# Altium footprint library MyLib.PcbLib: 45 footprints (part 2 of 3)
Each footprint in its own frame and in the unit in brackets; x right, y up, seen from the top. Pads: shape width x height; smd on the part's side, far side on the other; paste and mask are expansions set on the pad; w line width, h text height; cw(c..) or ccw(c..) is an arc to the next point about the centre after c.
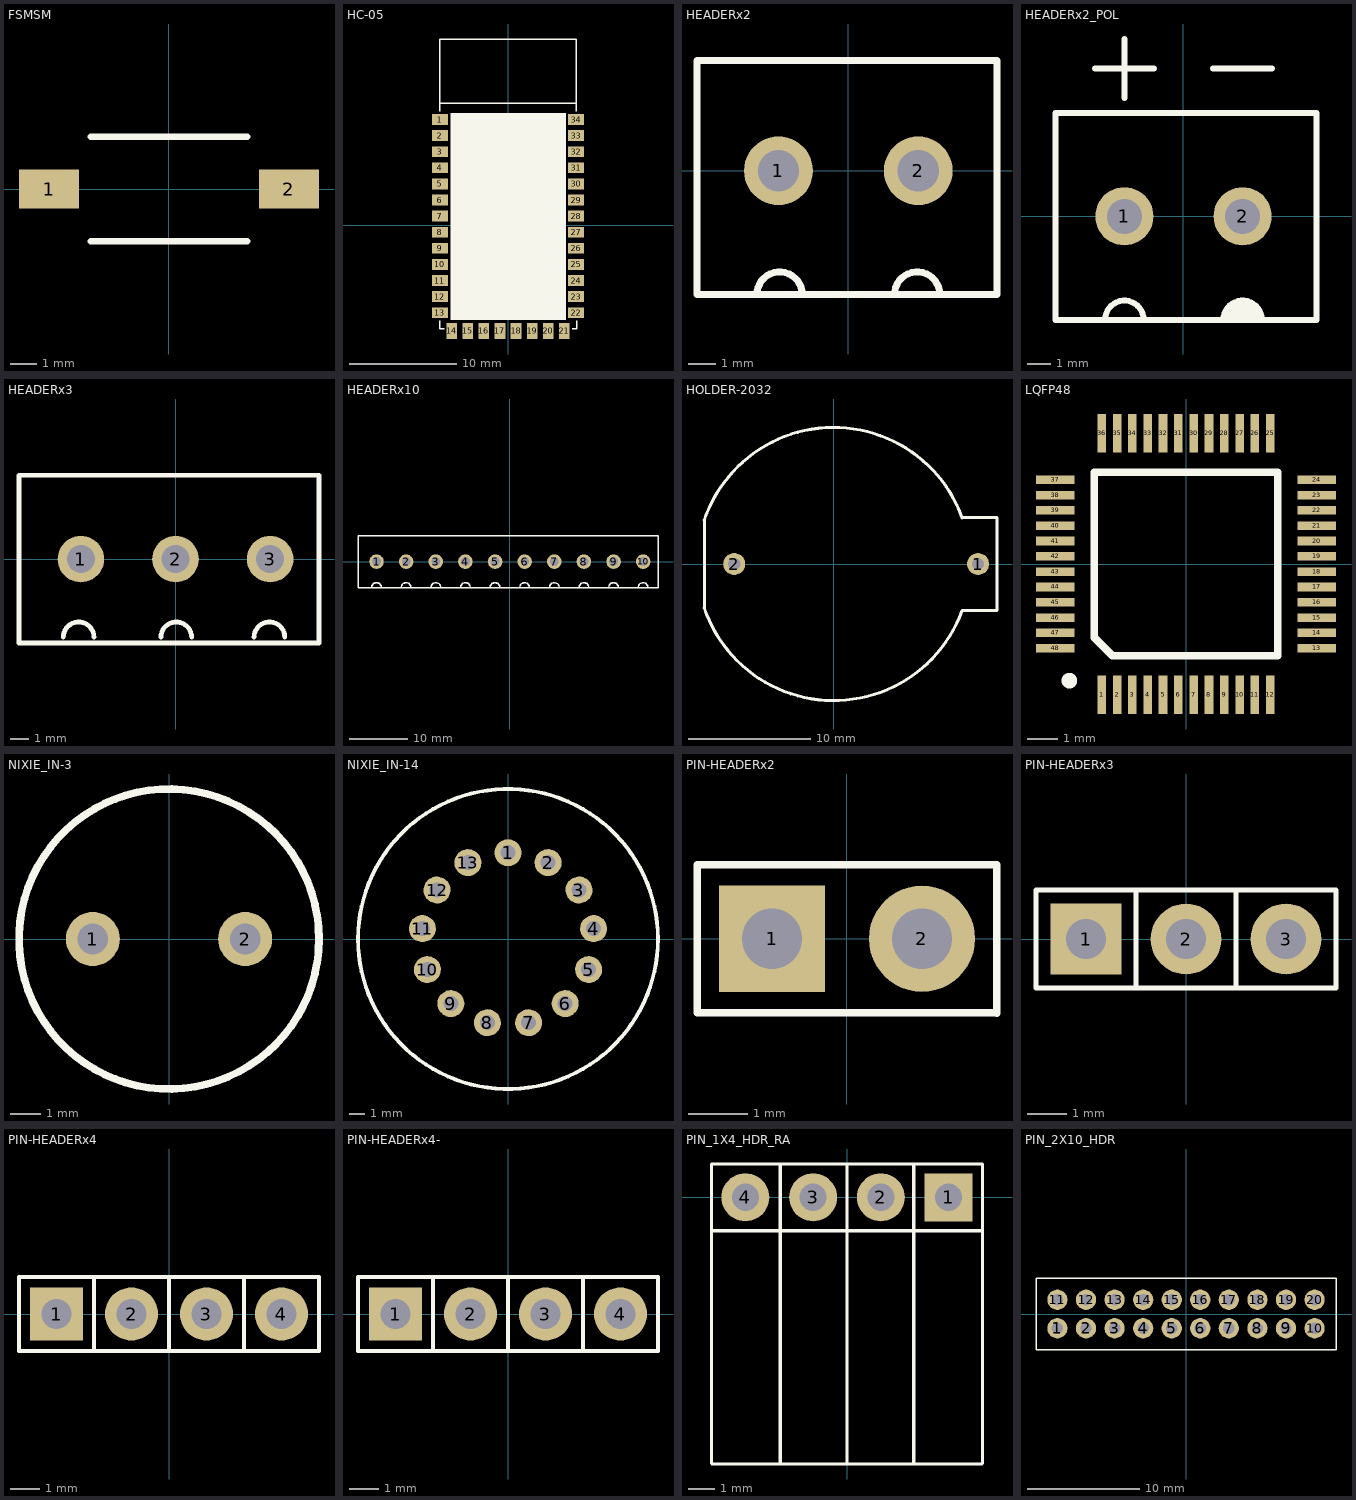
[diagram p1: the footprints below, top view; thin cyan lines are the x and y axes]

## FSMSM [mm]
pads (2):
  rect 2.3x1.5 smd: 1(-4.6,0) 2(4.6,0)
Top Overlay:
  lines w0.254: -3,-2 3,-2 ; -3,2 3,2
3D body "1703878_fsmsm.stp": height 4.4, standoff -0.02, extent -4.985,-1.75 4.985,1.75

## HC-05 [mm]
pads (34):
  rect 1.5x1 smd: 1(-6.35,9.85) 2(-6.35,8.35) 3(-6.35,6.85) 4(-6.35,5.35) 5(-6.35,3.85) 6(-6.35,2.35) 7(-6.35,0.85) 8(-6.35,-0.65) 9(-6.35,-2.15) 10(-6.35,-3.65) 11(-6.35,-5.15) 12(-6.35,-6.65) 13(-6.35,-8.15) 22(6.35,-8.15) 23(6.35,-6.65) 24(6.35,-5.15) 25(6.35,-3.65) 26(6.35,-2.15) 27(6.35,-0.65) 28(6.35,0.85) 29(6.35,2.35) 30(6.35,3.85) 31(6.35,5.35) 32(6.35,6.85) 33(6.35,8.35) 34(6.35,9.85)
  rect 1x1.5 smd: 14(-5.25,-9.85) 15(-3.75,-9.85) 16(-2.25,-9.85) 17(-0.75,-9.85) 18(0.75,-9.85) 19(2.25,-9.85) 20(3.75,-9.85) 21(5.25,-9.85)
Top Overlay:
  rectangle: -5.38,-8.84 5.4,10.44
  lines w0.127: -6.35,-8.9 -6.35,-9.65 -5.95,-9.65 ; -6.35,10.6 -6.35,17.35 6.35,17.35 6.35,10.6 ; -6.35,11.35 6.35,11.35 ; 6,-9.65 6.4,-9.65 6.4,-8.9
3D body "User Library-Bluetooth HC-06_.STEP": height 2.35, standoff 0, extent -6.99,-10.05 7.03,17.96

## HEADERx2 [mm]
pads (2):
  round 2.5 hole 1.5: 1(-2.54,0) 2(2.54,0)
Top Overlay:
  lines w0.254: -3.325,-4.5 cw(c-2.5,-4.5) -1.675,-4.5 ; 1.675,-4.5 cw(c2.5,-4.5) 3.325,-4.5 ; -5.5,-4.5 -5.5,4 5.4,4 5.4,-4.5 -5.5,-4.5
3D body "c-282837-2-g2-3d.stp": height 10.25, standoff -3.25, extent -5.38,-4.3 5.38,3.9

## HEADERx2_POL [mm]
pads (2):
  round 2.5 hole 1.5: 1(-2.54,0) 2(2.54,0)
Top Overlay:
  lines w0.254: -3.81,6.35 -1.27,6.35 ; -3.365,-4.445 cw(c-2.54,-4.445) -1.715,-4.445 ; -2.54,5.08 -2.54,7.62 ; 1.27,6.35 3.81,6.35 ; 1.715,-4.445 cw(c2.54,-4.445) 3.365,-4.445 ; 1.905,-4.445 cw(c2.54,-4.445) 3.175,-4.445 ; 2.032,-4.445 cw(c2.54,-4.445) 3.048,-4.445 ; 2.159,-4.445 cw(c2.54,-4.445) 2.921,-4.445 ; 2.286,-4.445 cw(c2.54,-4.445) 2.794,-4.445 ; 2.413,-4.445 cw(c2.54,-4.445) 2.667,-4.445 ; -5.5,-4.445 5.715,-4.445 5.715,4.445 -5.5,4.445 -5.5,-4.445
3D body "c-282837-2-g2-3d.stp": height 10.25, standoff -3.25, extent -5.58,-4 5.18,4.2

## HEADERx3 [mm]
pads (3):
  round 2.5 hole 1.5: 1(-5.08,0) 2(0,0) 3(5.08,0)
Top Overlay:
  lines w0.254: -6.025,-4.2 cw(c-5.2,-4.2) -4.375,-4.2 ; -0.785,-4.2 cw(c0.04,-4.2) 0.865,-4.2 ; 4.215,-4.2 cw(c5.04,-4.2) 5.865,-4.2 ; -8.4,-4.5 7.7,-4.5 7.7,4.5 -8.4,4.5 -8.4,-4.5
3D body "c-282837-3-g2-3d.stp": height 10.25, standoff -3.25, extent -8.32,-4.1 7.52,4.1

## HEADERx10 [mm]
pads (10):
  round 2.5 hole 1.5: 1(-22.86,0) 2(-17.78,0) 3(-12.7,0) 4(-7.62,0) 5(-2.54,0) 6(2.54,0) 7(7.62,0) 8(12.7,0) 9(17.78,0) 10(22.86,0)
Top Overlay:
  lines w0.254: -23.685,-4.445 cw(c-22.86,-4.445) -22.035,-4.445 ; -18.605,-4.445 cw(c-17.78,-4.445) -16.955,-4.445 ; -13.525,-4.445 cw(c-12.7,-4.445) -11.875,-4.445 ; -8.445,-4.445 cw(c-7.62,-4.445) -6.795,-4.445 ; -3.365,-4.445 cw(c-2.54,-4.445) -1.715,-4.445 ; 1.715,-4.445 cw(c2.54,-4.445) 3.365,-4.445 ; 6.795,-4.445 cw(c7.62,-4.445) 8.445,-4.445 ; 11.875,-4.445 cw(c12.7,-4.445) 13.525,-4.445 ; 16.955,-4.445 cw(c17.78,-4.445) 18.605,-4.445 ; 22.035,-4.445 cw(c22.86,-4.445) 23.685,-4.445 ; -26.035,-4.445 25.4,-4.445 25.4,4.445 -26.035,4.445 -26.035,-4.445
3D body "c-1-282837-0-g2-3d.stp": height 9.79, standoff -3.71, extent -26.081,-4.136 25.319,4.064

## HOLDER-2032 [mm]
pads (2):
  round 1.8 hole 1: 1(11.85,0) 2(-8.15,0)
Top Overlay:
  lines w0.254: -10.607,-3.602 ccw(c0,0) 10.526,-3.831 ; -10.605,3.602 cw(c0,0) 10.543,3.78 ; -10.6,-3.6 -10.6,3.6 ; 10.557,-3.8 13.4,-3.8 13.4,3.8 10.563,3.8
3D body "User Library-CR2032_HOR_HOLD.STEP": height 8.5, standoff -4, extent -11,-11.2 13.5,10.8

## LQFP48 [mm]
pads (48):
  rect 0.28x1.25 smd: 1(-2.75,-4.274) 2(-2.25,-4.274) 3(-1.75,-4.274) 4(-1.25,-4.274) 5(-0.75,-4.274) 6(-0.25,-4.274) 7(0.25,-4.274) 8(0.75,-4.274) 9(1.25,-4.274) 10(1.75,-4.274) 11(2.25,-4.274) 12(2.75,-4.274) 25(2.75,4.274) 26(2.25,4.274) 27(1.75,4.274) 28(1.25,4.274) 29(0.75,4.274) 30(0.25,4.274) 31(-0.25,4.274) 32(-0.75,4.274) 33(-1.25,4.274) 34(-1.75,4.274) 35(-2.25,4.274) 36(-2.75,4.274)
  rect 1.25x0.28 smd: 13(4.274,-2.75) 14(4.274,-2.25) 15(4.274,-1.75) 16(4.274,-1.25) 17(4.274,-0.75) 18(4.274,-0.25) 19(4.274,0.25) 20(4.274,0.75) 21(4.274,1.25) 22(4.274,1.75) 23(4.274,2.25) 24(4.274,2.75) 37(-4.274,2.75) 38(-4.274,2.25) 39(-4.274,1.75) 40(-4.274,1.25) 41(-4.274,0.75) 42(-4.274,0.25) 43(-4.274,-0.25) 44(-4.274,-0.75) 45(-4.274,-1.25) 46(-4.274,-1.75) 47(-4.274,-2.25) 48(-4.274,-2.75)
Top Overlay:
  circle w0.254: c-3.81,-3.81 r0.127
  lines w0.254: -3,-2.4 -3,3 3,3 3,-3 -2.4,-3 -3,-2.4
3D body "User Library-LQFP48_Grid_0_5.STEP": height 1.6, standoff 0, extent -4.5,-4.499 4.5,4.501

## NIXIE_IN-3 [mm]
pads (2):
  round 1.8 hole 1.02: 1(-2.54,0) 2(2.54,0)
Top Overlay:
  circle w0.254: c0,0 r5
3D body "NX-SPC-IN3.SLDPRT": height 7.5, standoff 0, extent -5,-5 5,5

## NIXIE_IN-14 [mm]
pads (13):
  round 1.8 hole 1: 1(0,5.75) 2(2.672,5.091) 3(4.732,3.266) 4(5.708,0.693) 5(5.376,-2.039) 6(3.813,-4.304) 7(1.376,-5.583) 8(-1.376,-5.583) 9(-3.813,-4.304) 10(-5.376,-2.039) 11(-5.708,0.693) 12(-4.732,3.266) 13(-2.672,5.091)
Top Overlay:
  circle w0.254: c0,0 r10
3D body "NX-SPC-IN14.SLDPRT": height 7.5, standoff 0, extent -9.25,-9.25 9.25,9.25

## PIN-HEADERx2 [mm]
pads (2):
  rect 1.8x1.8 hole 1.02: 1(-1.27,0)
  round 1.8 hole 1.02: 2(1.27,0)
Top Overlay:
  lines w0.127: 2.53,-1.25 -2.54,-1.25 -2.54,1.25 2.54,1.25 2.54,-1.26

## PIN-HEADERx3 [mm]
pads (3):
  rect 1.8x1.8 hole 1.02: 1(-2.54,0)
  round 1.8 hole 1.02: 2(0,0) 3(2.54,0)
Top Overlay:
  lines w0.127: -1.27,-1.25 -1.27,1.25 ; 1.27,-1.25 1.27,1.25 ; -3.81,-1.25 -3.81,1.25 3.81,1.25 3.81,-1.25 -3.81,-1.25

## PIN-HEADERx4 [mm]
pads (4):
  rect 1.8x1.8 hole 1.02: 1(-3.81,0)
  round 1.8 hole 1.02: 2(-1.27,0) 3(1.27,0) 4(3.81,0)
Top Overlay:
  lines w0.127: -2.54,-1.25 -2.54,1.25 ; 0,-1.25 0,1.25 ; 2.54,-1.25 2.54,1.25 ; -5.08,-1.25 5.08,-1.25 5.08,1.25 -5.08,1.25 -5.08,-1.25
3D body "65781.stp": height 8.77, standoff -2.77, extent -5.08,-1.27 5.08,1.27

## PIN-HEADERx4- [mm]
pads (4):
  rect 1.8x1.8 hole 1.02: 1(-3.81,0)
  round 1.8 hole 1.02: 2(-1.27,0) 3(1.27,0) 4(3.81,0)
Top Overlay:
  lines w0.127: -2.54,-1.25 -2.54,1.25 ; 0,-1.25 0,1.25 ; 2.54,-1.25 2.54,1.25 ; -5.08,-1.25 5.08,-1.25 5.08,1.25 -5.08,1.25 -5.08,-1.25

## PIN_1X4_HDR_RA [mm]
pads (4):
  rect 1.8x1.8 hole 1.02: 1(3.81,0)
  round 1.8 hole 1.02: 2(1.27,0) 3(-1.27,0) 4(-3.81,0)
Top Overlay:
  lines w0.127: -2.5,-10 -2.5,1.25 ; 0,-10 0,1.25 ; 2.5,-10 2.5,1.25 ; 5.06,-10 -5.06,-10 -5.08,-9.98 -5.08,-1.25 ; 5.08,-9.98 5.08,-1.25 ; -5.08,-1.25 5.08,-1.25 ; -5.08,-1.25 -5.08,1.25 5.08,1.25 5.08,-1.25
3D body "TSW-104-08-F-S-RA.stp": height 3.27, standoff -2.04, extent -5.08,-9.882 5.08,0.342

## PIN_2X10_HDR [mm]
pads (20):
  round 1.8 hole 1.02: 1(-11.43,-1.27) 2(-8.89,-1.27) 3(-6.35,-1.27) 4(-3.81,-1.27) 5(-1.27,-1.27) 6(1.27,-1.27) 7(3.81,-1.27) 8(6.35,-1.27) 9(8.89,-1.27) 10(11.43,-1.27) 11(-11.43,1.27) 12(-8.89,1.27) 13(-6.35,1.27) 14(-3.81,1.27) 15(-1.27,1.27) 16(1.27,1.27) 17(3.81,1.27) 18(6.35,1.27) 19(8.89,1.27) 20(11.43,1.27)
Top Overlay:
  lines w0.127: -13.335,-3.175 -13.335,3.175 13.335,3.175 13.335,-3.175 -13.335,-3.175
3D body "TSW-110-15-F-D-LL.stp": height 2.29, standoff -16.26, extent -12.7,-2.54 12.7,2.54